# Altium footprint library 19-Resistors.PcbLib: 199 footprints (part 4 of 13)
Each footprint in its own frame and in the unit in brackets; x right, y up, seen from the top. Pads: shape width x height; smd on the part's side, far side on the other; paste and mask are expansions set on the pad; w line width, h text height; cw(c..) or ccw(c..) is an arc to the next point about the centre after c.
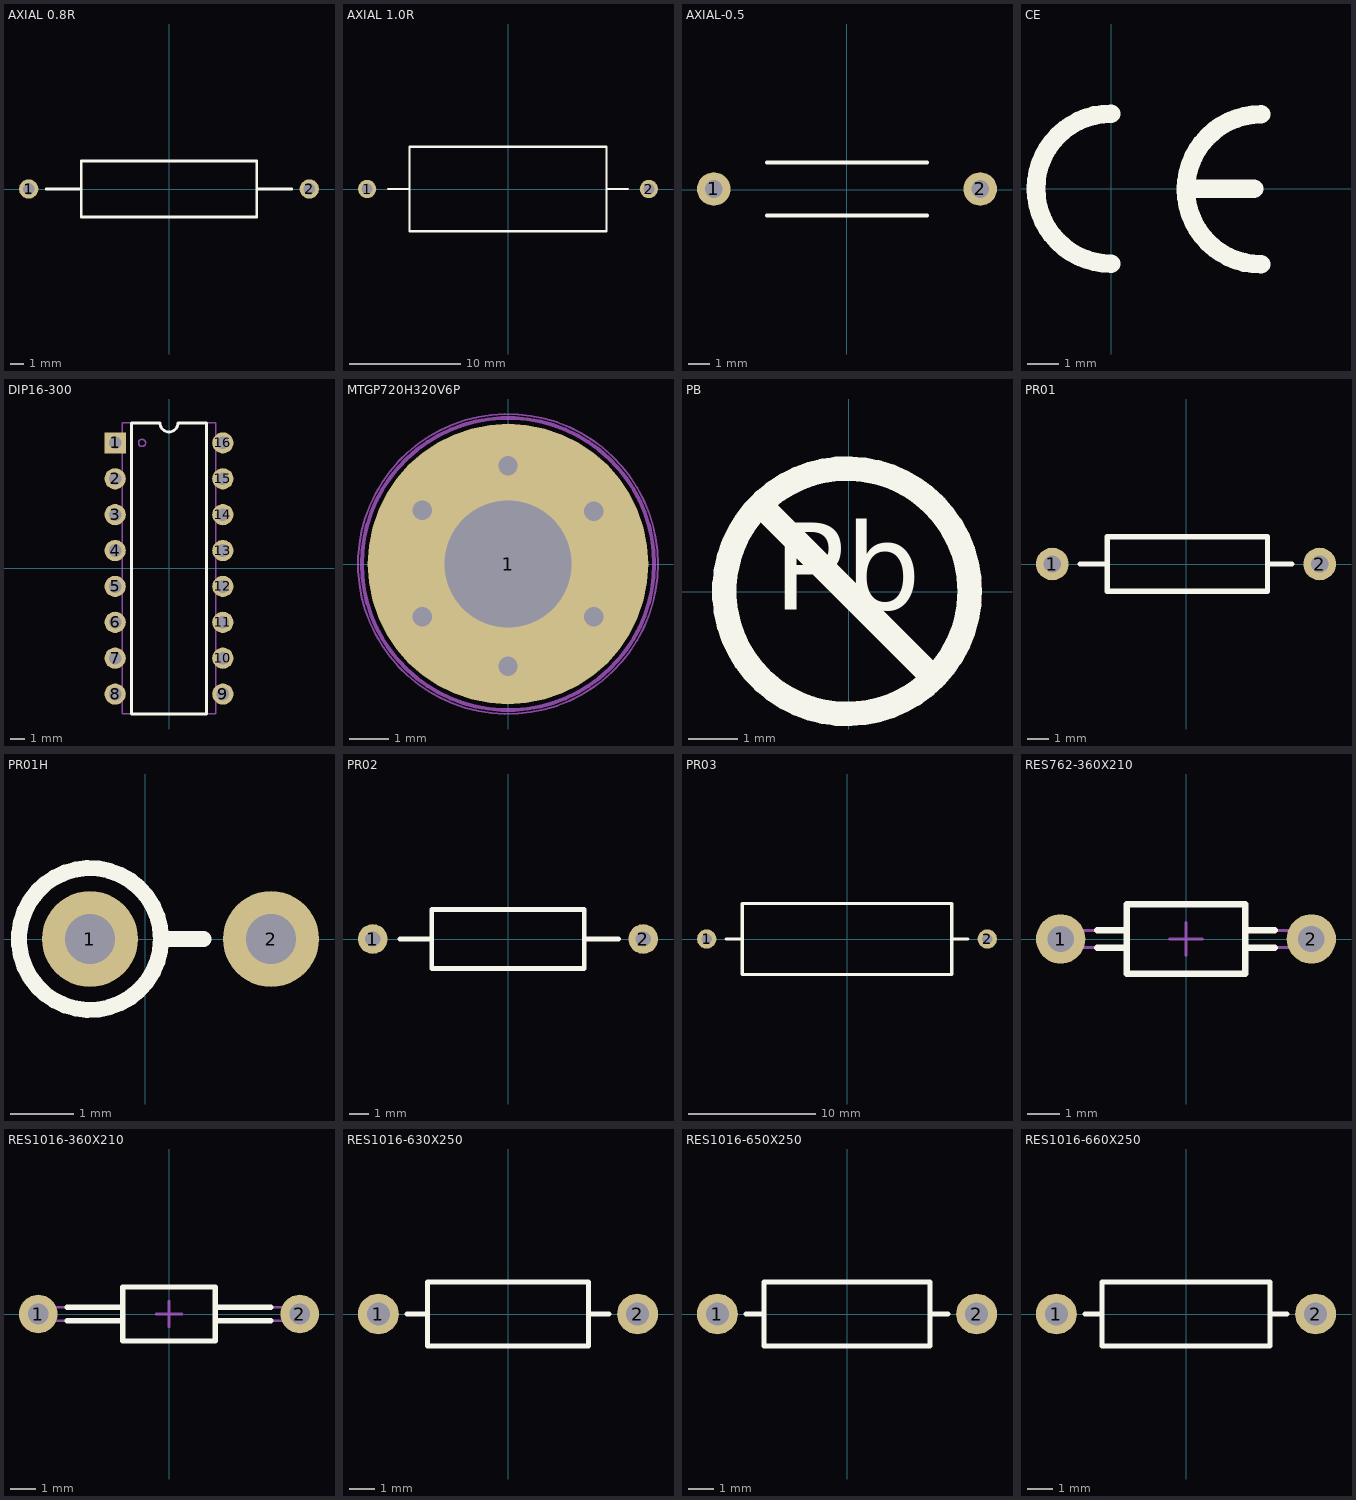
[diagram p3: the footprints below, top view; thin cyan lines are the x and y axes]

## AXIAL 0.8R [mm] "Axial Device, Thru-Hole; 2 Leads; 0.8 in Pin Spacing"
height 4.064
pads (2):
  round 1.4 hole 0.85 mask+0.07: 1(-10.16,0)
  round 1.4 hole 0.85: 2(10.16,0)
Top Overlay:
  lines w0.2: -8.89,0 -6.35,0 ; 6.35,0 8.89,0 ; -6.35,-2.032 -6.35,2.032 6.35,2.032 6.35,-2.032 -6.35,-2.032
3D body "1_5-1_5-0_7.stp": height 0.05, standoff -1.05, extent 9.41,-0.75 10.91,0.75
3D body "1_5-1_5-0_7.stp": height 0.05, standoff -1.05, extent -10.91,-0.75 -9.41,0.75
3D body "res_m2w.stp": height 5, standoff -2.5, extent -10.475,-2.54 10.475,2.46

## AXIAL 1.0R [mm] "Axial Device, Thru-Hole; 2 Leads; 1.0 in Pin Spacing"
height 7.62
pads (2):
  round 1.65 hole 1: 1(-12.7,0)
  round 1.65 hole 1 mask+0.07: 2(12.7,0)
Top Overlay:
  lines w0.2: -10.795,0 -8.89,0 ; 8.89,0 10.795,0 ; -8.89,-3.81 -8.89,3.81 8.89,3.81 8.89,-3.81 -8.89,-3.81
3D body "1_5-1_5-0_7.stp": height 0.05, standoff -1.05, extent 11.95,-0.75 13.45,0.75
3D body "1_5-1_5-0_7.stp": height 0.05, standoff -1.05, extent -13.45,-0.75 -11.95,0.75
3D body "res_m3w.stp": height 5.96, standoff -2.5, extent -13.05,-3.048 13.05,2.876

## AXIAL-0.5 [mm]
height 7.62
pads (2):
  round 1.6 hole 0.85 mask+0.07: 1(-6.35,0.025)
  round 1.6 hole 0.85: 2(6.35,0.025)
Top Overlay:
  lines w0.2: -3.81,-1.245 3.81,-1.245 ; -3.81,1.295 3.81,1.295
3D body "1_5-1_5-0_7.stp": height 0.05, standoff -1.05, extent -7.1,-0.725 -5.6,0.775
3D body "1_5-1_5-0_7.stp": height 0.05, standoff -1.05, extent 5.6,-0.725 7.1,0.775
3D body "res_m1-2w.stp": height 3, standoff -2.5, extent -6.65,-1.499 6.65,1.499

## CE [mm]
Top Overlay:
  lines w0.6: 0,-2.413 cw(c0,0) 0,2.413 ; 2.53,0 4.6,0 ; 4.826,-2.438 cw(c4.826,-0.025) 4.826,2.388
3D body "ce.stp": height 0.02, standoff 0, extent -2.725,-2.725 4.82,2.725

## DIP16-300 [mm] "DIP 16 Leads, Row Spacing 7.62 mm; Pitch 2.54 mm"
height 5.08
pads (16):
  rect 1.5x1.5 hole 0.9: 1(-3.81,8.89)
  round 1.5 hole 0.9: 2(-3.81,6.35) 3(-3.81,3.81) 4(-3.81,1.27) 5(-3.81,-1.27) 6(-3.81,-3.81) 7(-3.81,-6.35) 8(-3.81,-8.89) 9(3.81,-8.89) 10(3.81,-6.35) 11(3.81,-3.81) 12(3.81,-1.27) 13(3.81,1.27) 14(3.81,3.81) 15(3.81,6.35) 16(3.81,8.89)
Top Overlay:
  lines w0.2: -2.65,-10.3 2.65,-10.3 2.65,10.3 0.635,10.3 cw(c0,10.3) -0.635,10.3 -2.65,10.3 -2.65,-10.3
Mechanical 14:
  circle w0.1: c-1.905,8.89 r0.254
  lines w0.1: -3.3,-10.3 -3.3,10.3 -0.67,10.3 ccw(c-0.035,10.3) 0.6,10.3 3.3,10.3 3.3,-10.3 -3.3,-10.3
3D body "vf150-090.stp": height 0.01, standoff -1.65, extent -4.56,8.14 -3.06,9.64
3D body "v150-090.stp": height 0.02, standoff -1.65, extent 3.06,8.14 4.56,9.64
3D body "v150-090.stp": height 0.02, standoff -1.65, extent 3.06,5.6 4.56,7.1
3D body "v150-090.stp": height 0.02, standoff -1.65, extent 3.06,3.06 4.56,4.56
3D body "v150-090.stp": height 0.02, standoff -1.65, extent 3.06,0.52 4.56,2.02
3D body "v150-090.stp": height 0.02, standoff -1.65, extent 3.06,-2.02 4.56,-0.52
3D body "v150-090.stp": height 0.02, standoff -1.65, extent 3.06,-4.56 4.56,-3.06
3D body "v150-090.stp": height 0.02, standoff -1.65, extent 3.06,-7.1 4.56,-5.6
3D body "v150-090.stp": height 0.02, standoff -1.65, extent 3.06,-9.64 4.56,-8.14
3D body "v150-090.stp": height 0.02, standoff -1.65, extent -4.56,-9.64 -3.06,-8.14
3D body "v150-090.stp": height 0.02, standoff -1.65, extent -4.56,-7.1 -3.06,-5.6
3D body "v150-090.stp": height 0.02, standoff -1.65, extent -4.56,-4.56 -3.06,-3.06
3D body "v150-090.stp": height 0.02, standoff -1.65, extent -4.56,-2.02 -3.06,-0.52
3D body "v150-090.stp": height 0.02, standoff -1.65, extent -4.56,0.52 -3.06,2.02
3D body "v150-090.stp": height 0.02, standoff -1.65, extent -4.56,3.06 -3.06,4.56
3D body "v150-090.stp": height 0.02, standoff -1.65, extent -4.56,5.6 -3.06,7.1
3D body "DIP16-300.stp": height 5.33, standoff -3.3, extent -3.935,-10.16 3.935,10.16

## MTGP720H320V6P [mm]
pads (1):
  round 7.2 hole 3.25: 1(0,0)
via 2.2,-1.35 diameter 1 hole 0.5
via 0,-2.625 diameter 1 hole 0.5
via 2.2,1.35 diameter 1 hole 0.5
via 0,2.525 diameter 1 hole 0.5
via -2.2,1.375 diameter 1 hole 0.5
via -2.2,-1.35 diameter 1 hole 0.5
Mechanical 8:
  circle w0.1: c0,0 r3.75
  circle w0.1: c0,0 r2.6
  lines w0.1: -2.657,1.625 -2.224,1.375 ; -2.632,-1.6 -2.199,-1.35 ; -2.474,0.942 -2.224,1.375 ; -2.449,-0.917 -2.199,-1.35 ; -1.974,1.808 -2.224,1.375 ; -1.949,-1.783 -2.199,-1.35 ; -1.791,1.125 -2.224,1.375 ; -1.766,-1.1 -2.199,-1.35 ; -0.5,-2.625 0,-2.625 ; -0.5,0 0,0 ; -0.5,2.525 0,2.525 ; 0,-3.125 0,-2.625 ; 0,-2.125 0,-2.625 ; 0,-0.5 0,0 ; 0,0.5 0,0 ; 0,2.025 0,2.525 ; 0,3.025 0,2.525 ; 0.5,-2.625 0,-2.625 ; 0.5,0 0,0 ; 0.5,2.525 0,2.525 ; 1.766,-1.1 2.199,-1.35 ; 1.766,1.1 2.199,1.35 ; 1.949,-1.783 2.199,-1.35 ; 1.949,1.783 2.199,1.35 ; 2.449,-0.917 2.199,-1.35 ; 2.449,0.917 2.199,1.35 ; 2.632,-1.6 2.199,-1.35 ; 2.632,1.6 2.199,1.35
Mechanical 14:
  circle w0.1: c0,0 r3.75
Mechanical 15:
  circle w0.05: c0,0 r3.85
3D body "mtgp720h320v6p.stp": height 0.1, standoff -1.75, extent -3.627,-3.627 3.628,3.628

## PB [mm]
Top Overlay:
  circle w0.5: c-0.031,0.013 r2.5
  lines w0.5: -1.737,1.719 1.675,-1.693
  text "Pb" at -1.536,-0.948 h3.05
3D body "pb.stp": height 0.02, standoff 0, extent -2.725,-2.725 2.725,2.725

## PR01 [mm] "Vishay"
height 11.7
pads (2):
  round 1.524 hole 0.8: 1(-6.25,0) 2(6.25,0)
Top Overlay:
  lines w0.254: -4.953,0 -3.683,0 ; 3.81,0 4.953,0 ; -3.683,-1.27 -3.683,1.27 3.81,1.27 3.81,-1.27 -3.683,-1.27
3D body "pr01.stp": height 7.25, standoff -3.23, extent -7.023,-1.25 7.023,1.25
3D body "v150-080.stp": height 0.02, standoff -1.65, extent -7,-0.75 -5.5,0.75
3D body "v150-080.stp": height 0.02, standoff -1.65, extent 5.5,-0.75 7,0.75

## PR01H [mil]
pads (2):
  round 60 hole 31.5: 1(-34.45,0) 2(78.74,0)
Top Overlay:
  circle w10: c-34.45,0 r44.39
  lines w10: 9.94,0 36.42,0
3D body "pr01h.stp": height 407.96, standoff -102.26, extent -69.88,-49.21 103.17,49.21
3D body "v150-080.stp": height 0.79, standoff -64.96, extent 49.22,-29.52 108.27,29.53
3D body "v150-080.stp": height 0.79, standoff -64.96, extent -64.95,-29.52 -5.9,29.53

## PR02 [mil] "Vishay"
height 460.63
pads (2):
  round 60 hole 31.5: 1(-275,0) 2(275,0)
Top Overlay:
  lines w10: -220,0 -155,0 ; 155,0 225,0 ; -155,-60 -155,60 155,60 155,-60 -155,-60
3D body "pr01.stp": height 285.43, standoff -127.25, extent -276.51,-49.21 276.52,49.21
3D body "v150-080.stp": height 0.79, standoff -64.96, extent -304.52,-29.52 -245.47,29.53
3D body "v150-080.stp": height 0.79, standoff -64.96, extent 245.48,-29.52 304.53,29.53

## PR03 [mil]
height 460.63
pads (2):
  round 60 hole 31.5: 1(-435,0) 2(435,0)
Top Overlay:
  lines w10: -375,0 -325,0 ; 325,0 375,0 ; -325,-110 325,-110 325,110 -325,110 -325,-110
3D body "pr03.stp": height 417.32, standoff -149.06, extent -467.6,-102.35 467.58,102.37
3D body "v150-080.stp": height 0.79, standoff -64.96, extent -464.52,-29.52 -405.47,29.53
3D body "v150-080.stp": height 0.79, standoff -64.96, extent 405.48,-29.52 464.53,29.53

## RES762-360X210 [mm] "Resistor, Axial, Pad spacing 7.62mm - Body Lengh 3.6mm X Body Diameter 2.1mm"
height 2.1
pads (2):
  round 1.5 hole 0.8: 1(-3.81,0) 2(3.81,0)
Top Overlay:
  lines w0.2: -2.69,-0.26 -1.8,-0.26 ; -2.69,0.26 -1.8,0.26 ; 1.8,-0.26 2.69,-0.26 ; 1.8,0.26 2.69,0.26 ; -1.8,-1.05 -1.8,1.05 1.8,1.05 1.8,-1.05 -1.8,-1.05
Mechanical 8:
  lines w0.1: -4.31,0 -3.81,0 ; -3.81,-0.5 -3.81,0 ; -3.81,0.5 -3.81,0 ; -3.31,0 -3.81,0 ; -0.5,0 0,0 ; 0,-0.5 0,0 ; 0,0.5 0,0 ; 0.5,0 0,0 ; 3.31,0 3.81,0 ; 3.81,-0.5 3.81,0 ; 3.81,0.5 3.81,0 ; 4.31,0 3.81,0
Mechanical 14:
  lines w0.1: -1.8,-0.26 -3.81,-0.26 cw(c-3.81,0) -3.81,0.26 -1.8,0.26 ; 1.8,-0.26 3.81,-0.26 ccw(c3.81,0) 3.81,0.26 1.8,0.26 ; -1.8,-1.05 -1.8,1.05 1.8,1.05 1.8,-1.05 -1.8,-1.05
3D body "v150-080.stp": height 0.02, standoff -1.65, extent 3.06,-0.75 4.56,0.75
3D body "v150-080.stp": height 0.02, standoff -1.65, extent -4.56,-0.75 -3.06,0.75
3D body "RES762-360X210.stp": height 2.1, standoff -3.6, extent -4.07,-1.05 4.07,1.05

## RES1016-360X210 [mm] "Resistor, Axial, Pad spacing 10.16 mm - Body Lengh 3.6mm X Body Diameter 2.1mm"
height 2.1
pads (2):
  round 1.5 hole 0.8: 1(-5.08,0) 2(5.08,0)
Top Overlay:
  lines w0.2: -3.96,-0.26 -1.8,-0.26 ; -3.96,0.26 -1.8,0.26 ; 1.8,-0.26 3.96,-0.26 ; 1.8,0.26 3.96,0.26 ; -1.8,-1.05 1.8,-1.05 1.8,1.05 -1.8,1.05 -1.8,-1.05
Mechanical 8:
  lines w0.1: -5.58,0 -5.08,0 ; -5.08,-0.5 -5.08,0 ; -5.08,0.5 -5.08,0 ; -4.58,0 -5.08,0 ; -0.5,0 0,0 ; 0,-0.5 0,0 ; 0,0.5 0,0 ; 0.5,0 0,0 ; 4.58,0 5.08,0 ; 5.08,-0.5 5.08,0 ; 5.08,0.5 5.08,0 ; 5.58,0 5.08,0
Mechanical 14:
  lines w0.1: -1.8,-0.26 -5.08,-0.26 cw(c-5.08,0) -5.08,0.26 -1.8,0.26 ; 1.8,-0.26 5.08,-0.26 ccw(c5.08,0) 5.08,0.26 1.8,0.26 ; -1.8,-1.05 1.8,-1.05 1.8,1.05 -1.8,1.05 -1.8,-1.05
3D body "v150-080.stp": height 0.02, standoff -1.65, extent 4.33,-0.75 5.83,0.75
3D body "v150-080.stp": height 0.02, standoff -1.65, extent -5.83,-0.75 -4.33,0.75
3D body "RES1016-360X210.stp": height 2.1, standoff -3.6, extent -5.34,-1.05 5.34,1.05

## RES1016-630X250 [mm] "Resistor, Axial, Pad spacing 10.16 mm - Body Lengh 6.3mm X Body Diameter 2.5mm"
height 2.5
pads (2):
  round 1.6 hole 0.9: 1(-5.08,0) 2(5.08,0)
Top Overlay:
  lines w0.2: -3.95,0 -3.15,0 ; 3.15,0 3.95,0 ; -3.15,-1.25 -3.15,1.25 3.15,1.25 3.15,-1.25 -3.15,-1.25
Mechanical 14:
  lines w0.1: -3.95,0 -3.15,0 ; 3.15,0 3.95,0 ; -3.15,-1.25 3.15,-1.25 3.15,1.25 -3.15,1.25 -3.15,-1.25
3D body "v160-090.stp": height 0.02, standoff -1.65, extent 4.28,-0.8 5.88,0.8
3D body "v160-090.stp": height 0.02, standoff -1.65, extent -5.88,-0.8 -4.28,0.8
3D body "RES1016-630X250.stp": height 2.51, standoff -3.2, extent -5.38,-1.27 5.38,1.26

## RES1016-650X250 [mm] "Resistor, Axial, Pad spacing 10.16 mm - Body Lengh 6.5mm X Body Diameter 2.5mm"
height 2.5
pads (2):
  round 1.6 hole 0.9: 1(-5.08,0) 2(5.08,0)
Top Overlay:
  lines w0.2: -3.95,0 -3.25,0 ; 3.25,0 3.95,0 ; -3.25,-1.25 -3.25,1.25 3.25,1.25 3.25,-1.25 -3.25,-1.25
Mechanical 14:
  lines w0.1: -3.95,0 -3.25,0 ; 3.25,0 3.95,0 ; -3.25,-1.25 3.25,-1.25 3.25,1.25 -3.25,1.25 -3.25,-1.25
3D body "v160-090.stp": height 0.02, standoff -1.65, extent 4.28,-0.8 5.88,0.8
3D body "v160-090.stp": height 0.02, standoff -1.65, extent -5.88,-0.8 -4.28,0.8
3D body "RES1016-650X250.stp": height 2.51, standoff -3.2, extent -5.38,-1.27 5.38,1.26

## RES1016-660X250 [mm] "Resistor, Axial, Pad spacing 10.16 mm - Body Lengh 6.6mm X Body Diameter 2.5mm"
height 2.5
pads (2):
  round 1.6 hole 0.9: 1(-5.08,0) 2(5.08,0)
Top Overlay:
  lines w0.2: -3.95,0 -3.3,0 ; 3.3,0 3.95,0 ; -3.3,-1.25 -3.3,1.25 3.3,1.25 3.3,-1.25 -3.3,-1.25
Mechanical 14:
  lines w0.1: -3.95,0 -3.3,0 ; 3.3,0 3.95,0 ; -3.3,-1.25 3.3,-1.25 3.3,1.25 -3.3,1.25 -3.3,-1.25
3D body "v160-090.stp": height 0.02, standoff -1.65, extent 4.28,-0.8 5.88,0.8
3D body "v160-090.stp": height 0.02, standoff -1.65, extent -5.88,-0.8 -4.28,0.8
3D body "RES1016-660X250.stp": height 2.5, standoff -3.1, extent -5.38,-1.25 5.38,1.25